# Altium schematic symbol library jlcpcb_2025_04_capacitors_extended_0805.schlib: 3281 symbols (part 3 of 18) (continued)
## 0805F105Z250NT
designator C?  Capacitance: 1uF  (hidden comment: *)
Capacitor, Ceramic (MLCC), 1uF, 25V, Y5V, SMD 0805; Manufacturer: FH(Guangdong Fenghua Advanced Tech); Manufacturer Part Number: 0805F105Z250NT; Temperature Rating: -20%~+80%; Package Size: 0805; JLCPCB Basic Part: No; JLCPCB Part Number: C285184; Supplier 1: LCSC; Category: Capacitors - MLCC; Supplier Part Number 1: C285184; Voltage Rating: 25V; Temperature Coefficient: Y5V; RoHS: Yes; ComponentLink1Description: Datasheet; ComponentLink1URL: https://wmsc.lcsc.com/wmsc/upload/file/pdf/v2/lcsc/2304140030_FH--Guangdong-Fenghua-Advanced-Tech-0805F105Z250NT_C285184.pdf; ComponentLink2Description: JLCPCB Part URL; ComponentLink2URL: https://jlcpcb.com/partdetail/C285184; ComponentLink3Description: LCSC Part URL; ComponentLink3URL: https://lcsc.com/product-detail/Multilayer-Ceramic-Capacitors-MLCC---SMD-SMT_FH-Guangdong-Fenghua-Advanced-Tech-FH-Guangdong-Fenghua-Advanced-Tech-0805F105Z250NT_C285184.html
footprint CAP-0805 (0805 (2012M) Capacitor)
pins: 1, 2

## 0805F105Z500CT
designator C?  Capacitance: 1uF  (hidden comment: *)
Capacitor, Ceramic (MLCC), 1uF, 50V, Y5V, SMD 0805; Manufacturer: Walsin Tech Corp; Manufacturer Part Number: 0805F105Z500CT; Temperature Rating: -20%~+80%; Package Size: 0805; JLCPCB Basic Part: No; JLCPCB Part Number: C123630; Supplier 1: LCSC; Category: Capacitors - MLCC; Supplier Part Number 1: C123630; Voltage Rating: 50V; Temperature Coefficient: Y5V; RoHS: Yes; ComponentLink1Description: Datasheet; ComponentLink1URL: https://wmsc.lcsc.com/wmsc/upload/file/pdf/v2/lcsc/2304140030_Walsin-Tech-Corp-0805F105Z500CT_C123630.pdf; ComponentLink2Description: JLCPCB Part URL; ComponentLink2URL: https://jlcpcb.com/partdetail/C123630; ComponentLink3Description: LCSC Part URL; ComponentLink3URL: https://lcsc.com/product-detail/Multilayer-Ceramic-Capacitors-MLCC---SMD-SMT_Walsin-Tech-Corp-Walsin-Tech-Corp-0805F105Z500CT_C123630.html
footprint CAP-0805 (0805 (2012M) Capacitor)
pins: 1, 2

## 0805F105Z500NT
designator C?  Capacitance: 1uF  (hidden comment: *)
Capacitor, Ceramic (MLCC), 1uF, 50V, SMD 0805; Manufacturer: FH (Guangdong Fenghua Advanced Tech); Manufacturer Part Number: 0805F105Z500NT; Package Size: 0805; JLCPCB Basic Part: No; JLCPCB Part Number: C2894314; Supplier 1: LCSC; Category: Capacitors - MLCC; Supplier Part Number 1: C2894314; Voltage Rating: 50V; RoHS: Yes; ComponentLink1Description: Datasheet; ComponentLink1URL: https://wmsc.lcsc.com/wmsc/upload/file/pdf/v2/lcsc/2109100930_FH--Guangdong-Fenghua-Advanced-Tech-0805F105Z500NT_C2894314.pdf; ComponentLink2Description: JLCPCB Part URL; ComponentLink2URL: https://jlcpcb.com/partdetail/C2894314; ComponentLink3Description: LCSC Part URL; ComponentLink3URL: https://lcsc.com/product-detail/Multilayer-Ceramic-Capacitors-MLCC---SMD-SMT_FH-Guangdong-Fenghua-Advanced-Tech-FH-Guangdong-Fenghua-Advanced-Tech-0805F105Z500NT_C2894314.html
footprint CAP-0805 (0805 (2012M) Capacitor)
pins: 1, 2

## 0805F106M100NT
designator C?  Capacitance: 10uF  (hidden comment: *)
Capacitor, Ceramic (MLCC), 10uF, ±20%, 10V, Y5V, ±20%, SMD 0805; Manufacturer: FH(Guangdong Fenghua Advanced Tech); Manufacturer Part Number: 0805F106M100NT; Package Size: 0805; JLCPCB Basic Part: No; JLCPCB Part Number: C91158; Supplier 1: LCSC; Category: Capacitors - MLCC; Supplier Part Number 1: C91158; Tolerance: ±20%; Voltage Rating: 10V; Temperature Coefficient: Y5V; RoHS: Yes; ComponentLink1Description: Datasheet; ComponentLink1URL: https://wmsc.lcsc.com/wmsc/upload/file/pdf/v2/lcsc/2304140030_FH--Guangdong-Fenghua-Advanced-Tech-0805F106M100NT_C91158.pdf; ComponentLink2Description: JLCPCB Part URL; ComponentLink2URL: https://jlcpcb.com/partdetail/C91158; ComponentLink3Description: LCSC Part URL; ComponentLink3URL: https://lcsc.com/product-detail/Multilayer-Ceramic-Capacitors-MLCC---SMD-SMT_FH-Guangdong-Fenghua-Advanced-Tech-FH-Guangdong-Fenghua-Advanced-Tech-0805F106M100NT_C91158.html
footprint CAP-0805 (0805 (2012M) Capacitor)
pins: 1, 2

## 0805F106M160NT_C90545
designator C?  Capacitance: 10uF  (hidden comment: *)
Capacitor, Ceramic (MLCC), 10uF, ±20%, 16V, Y5V, ±20%, SMD 0805; Manufacturer: FH(Guangdong Fenghua Advanced Tech); Manufacturer Part Number: 0805F106M160NT; Package Size: 0805; JLCPCB Basic Part: No; JLCPCB Part Number: C90545; Supplier 1: LCSC; Category: Capacitors - MLCC; Supplier Part Number 1: C90545; Tolerance: ±20%; Voltage Rating: 16V; Temperature Coefficient: Y5V; RoHS: Yes; ComponentLink1Description: Datasheet; ComponentLink1URL: https://wmsc.lcsc.com/wmsc/upload/file/pdf/v2/lcsc/2304140030_FH--Guangdong-Fenghua-Advanced-Tech-0805F106M160NT_C90545.pdf; ComponentLink2Description: JLCPCB Part URL; ComponentLink2URL: https://jlcpcb.com/partdetail/C90545; ComponentLink3Description: LCSC Part URL; ComponentLink3URL: https://lcsc.com/product-detail/Multilayer-Ceramic-Capacitors-MLCC---SMD-SMT_FH-Guangdong-Fenghua-Advanced-Tech-FH-Guangdong-Fenghua-Advanced-Tech-0805F106M160NT_C90545.html
footprint CAP-0805 (0805 (2012M) Capacitor)
pins: 1, 2

## 0805F106M160NT_C5140354
designator C?  Capacitance: 10uF  (hidden comment: *)
Capacitor, Ceramic (MLCC), 10uF, ±20%, 16V, Y5V, ±20%, SMD 0805; Manufacturer: FH (Guangdong Fenghua Advanced Tech); Manufacturer Part Number: 0805F106M160NT; Package Size: 0805; JLCPCB Basic Part: No; JLCPCB Part Number: C5140354; Supplier 1: LCSC; Category: Capacitors - MLCC; Supplier Part Number 1: C5140354; Tolerance: ±20%; Voltage Rating: 16V; Temperature Coefficient: Y5V; RoHS: Yes; ComponentLink1Description: Datasheet; ComponentLink1URL: https://wmsc.lcsc.com/wmsc/upload/file/pdf/v2/lcsc/2208121800_FH--Guangdong-Fenghua-Advanced-Tech-0805F106M160NT_C5140354.pdf; ComponentLink2Description: JLCPCB Part URL; ComponentLink2URL: https://jlcpcb.com/partdetail/C5140354; ComponentLink3Description: LCSC Part URL; ComponentLink3URL: https://lcsc.com/product-detail/Multilayer-Ceramic-Capacitors-MLCC---SMD-SMT_FH-Guangdong-Fenghua-Advanced-Tech-FH-Guangdong-Fenghua-Advanced-Tech-0805F106M160NT_C5140354.html
footprint CAP-0805 (0805 (2012M) Capacitor)
pins: 1, 2

## 0805F106Z100CT
designator C?  Capacitance: 10uF  (hidden comment: *)
Capacitor, Ceramic (MLCC), 10uF, 10V, Y5V, SMD 0805; Manufacturer: Walsin Tech Corp; Manufacturer Part Number: 0805F106Z100CT; Temperature Rating: -20%~+80%; Package Size: 0805; JLCPCB Basic Part: No; JLCPCB Part Number: C83061; Supplier 1: LCSC; Category: Capacitors - MLCC; Supplier Part Number 1: C83061; Voltage Rating: 10V; Temperature Coefficient: Y5V; RoHS: Yes; ComponentLink1Description: Datasheet; ComponentLink1URL: https://wmsc.lcsc.com/wmsc/upload/file/pdf/v2/lcsc/1810231215_Walsin-Tech-Corp-0805F106Z100CT_C83061.pdf; ComponentLink2Description: JLCPCB Part URL; ComponentLink2URL: https://jlcpcb.com/partdetail/C83061; ComponentLink3Description: LCSC Part URL; ComponentLink3URL: https://lcsc.com/product-detail/Multilayer-Ceramic-Capacitors-MLCC---SMD-SMT_Walsin-Tech-Corp-Walsin-Tech-Corp-0805F106Z100CT_C83061.html
footprint CAP-0805 (0805 (2012M) Capacitor)
pins: 1, 2

## 0805F123M500NT
designator C?  Capacitance: 12nF  (hidden comment: *)
Capacitor, Ceramic (MLCC), 12nF, ±20%, 50V, Y5V, ±20%, SMD 0805; Manufacturer: FH(Guangdong Fenghua Advanced Tech); Manufacturer Part Number: 0805F123M500NT; Package Size: 0805; JLCPCB Basic Part: No; JLCPCB Part Number: C1763; Supplier 1: LCSC; Category: Capacitors - MLCC; Supplier Part Number 1: C1763; Tolerance: ±20%; Voltage Rating: 50V; Temperature Coefficient: Y5V; RoHS: Yes; ComponentLink1Description: Datasheet; ComponentLink1URL: https://wmsc.lcsc.com/wmsc/upload/file/pdf/v2/lcsc/2304140030_FH--Guangdong-Fenghua-Advanced-Tech-0805F123M500NT_C1763.pdf; ComponentLink2Description: JLCPCB Part URL; ComponentLink2URL: https://jlcpcb.com/partdetail/C1763; ComponentLink3Description: LCSC Part URL; ComponentLink3URL: https://lcsc.com/product-detail/Multilayer-Ceramic-Capacitors-MLCC---SMD-SMT_FH-Guangdong-Fenghua-Advanced-Tech-FH-Guangdong-Fenghua-Advanced-Tech-0805F123M500NT_C1763.html
footprint CAP-0805 (0805 (2012M) Capacitor)
pins: 1, 2

## 0805F124M500NT
designator C?  Capacitance: 120nF  (hidden comment: *)
Capacitor, Ceramic (MLCC), 120nF, ±20%, 50V, Y5V, ±20%, SMD 0805; Manufacturer: FH(Guangdong Fenghua Advanced Tech); Manufacturer Part Number: 0805F124M500NT; Package Size: 0805; JLCPCB Basic Part: No; JLCPCB Part Number: C1764; Supplier 1: LCSC; Category: Capacitors - MLCC; Supplier Part Number 1: C1764; Tolerance: ±20%; Voltage Rating: 50V; Temperature Coefficient: Y5V; RoHS: Yes; ComponentLink1Description: Datasheet; ComponentLink1URL: https://wmsc.lcsc.com/wmsc/upload/file/pdf/v2/lcsc/2304140030_FH--Guangdong-Fenghua-Advanced-Tech-0805F124M500NT_C1764.pdf; ComponentLink2Description: JLCPCB Part URL; ComponentLink2URL: https://jlcpcb.com/partdetail/C1764; ComponentLink3Description: LCSC Part URL; ComponentLink3URL: https://lcsc.com/product-detail/Multilayer-Ceramic-Capacitors-MLCC---SMD-SMT_FH-Guangdong-Fenghua-Advanced-Tech-FH-Guangdong-Fenghua-Advanced-Tech-0805F124M500NT_C1764.html
footprint CAP-0805 (0805 (2012M) Capacitor)
pins: 1, 2

## 0805F153M500NT
designator C?  Capacitance: 15nF  (hidden comment: *)
Capacitor, Ceramic (MLCC), 15nF, ±20%, 50V, Y5V, ±20%, SMD 0805; Manufacturer: FH(Guangdong Fenghua Advanced Tech); Manufacturer Part Number: 0805F153M500NT; Package Size: 0805; JLCPCB Basic Part: No; JLCPCB Part Number: C1765; Supplier 1: LCSC; Category: Capacitors - MLCC; Supplier Part Number 1: C1765; Tolerance: ±20%; Voltage Rating: 50V; Temperature Coefficient: Y5V; RoHS: Yes; ComponentLink1Description: Datasheet; ComponentLink1URL: https://wmsc.lcsc.com/wmsc/upload/file/pdf/v2/lcsc/2304140030_FH--Guangdong-Fenghua-Advanced-Tech-0805F153M500NT_C1765.pdf; ComponentLink2Description: JLCPCB Part URL; ComponentLink2URL: https://jlcpcb.com/partdetail/C1765; ComponentLink3Description: LCSC Part URL; ComponentLink3URL: https://lcsc.com/product-detail/Multilayer-Ceramic-Capacitors-MLCC---SMD-SMT_FH-Guangdong-Fenghua-Advanced-Tech-FH-Guangdong-Fenghua-Advanced-Tech-0805F153M500NT_C1765.html
footprint CAP-0805 (0805 (2012M) Capacitor)
pins: 1, 2

## 0805F183M500NT
designator C?  Capacitance: 18nF  (hidden comment: *)
Capacitor, Ceramic (MLCC), 18nF, ±20%, 50V, Y5V, ±20%, SMD 0805; Manufacturer: FH(Guangdong Fenghua Advanced Tech); Manufacturer Part Number: 0805F183M500NT; Package Size: 0805; JLCPCB Basic Part: No; JLCPCB Part Number: C1767; Supplier 1: LCSC; Category: Capacitors - MLCC; Supplier Part Number 1: C1767; Tolerance: ±20%; Voltage Rating: 50V; Temperature Coefficient: Y5V; RoHS: Yes; ComponentLink1Description: Datasheet; ComponentLink1URL: https://wmsc.lcsc.com/wmsc/upload/file/pdf/v2/lcsc/2304140030_FH--Guangdong-Fenghua-Advanced-Tech-0805F183M500NT_C1767.pdf; ComponentLink2Description: JLCPCB Part URL; ComponentLink2URL: https://jlcpcb.com/partdetail/C1767; ComponentLink3Description: LCSC Part URL; ComponentLink3URL: https://lcsc.com/product-detail/Multilayer-Ceramic-Capacitors-MLCC---SMD-SMT_FH-Guangdong-Fenghua-Advanced-Tech-FH-Guangdong-Fenghua-Advanced-Tech-0805F183M500NT_C1767.html
footprint CAP-0805 (0805 (2012M) Capacitor)
pins: 1, 2

## 0805F203M500NT
designator C?  Capacitance: 20nF  (hidden comment: *)
Capacitor, Ceramic (MLCC), 20nF, ±20%, 50V, Y5V, ±20%, SMD 0805; Manufacturer: FH(Guangdong Fenghua Advanced Tech); Manufacturer Part Number: 0805F203M500NT; Package Size: 0805; JLCPCB Basic Part: No; JLCPCB Part Number: C1768; Supplier 1: LCSC; Category: Capacitors - MLCC; Supplier Part Number 1: C1768; Tolerance: ±20%; Voltage Rating: 50V; Temperature Coefficient: Y5V; RoHS: Yes; ComponentLink1Description: Datasheet; ComponentLink1URL: https://wmsc.lcsc.com/wmsc/upload/file/pdf/v2/lcsc/2304140030_FH--Guangdong-Fenghua-Advanced-Tech-0805F203M500NT_C1768.pdf; ComponentLink2Description: JLCPCB Part URL; ComponentLink2URL: https://jlcpcb.com/partdetail/C1768; ComponentLink3Description: LCSC Part URL; ComponentLink3URL: https://lcsc.com/product-detail/Multilayer-Ceramic-Capacitors-MLCC---SMD-SMT_FH-Guangdong-Fenghua-Advanced-Tech-FH-Guangdong-Fenghua-Advanced-Tech-0805F203M500NT_C1768.html
footprint CAP-0805 (0805 (2012M) Capacitor)
pins: 1, 2

## 0805F204M500NT
designator C?  Capacitance: 200000pF  (hidden comment: *)
Capacitor, Ceramic (MLCC), 200000pF, ±20%, 50V, Y5V, ±20%, SMD 0805; Manufacturer: FH (Guangdong Fenghua Advanced Tech); Manufacturer Part Number: 0805F204M500NT; Package Size: 0805; JLCPCB Basic Part: No; JLCPCB Part Number: C967588; Supplier 1: LCSC; Category: Capacitors - MLCC; Supplier Part Number 1: C967588; Tolerance: ±20%; Voltage Rating: 50V; Temperature Coefficient: Y5V; RoHS: Yes; ComponentLink1Description: Datasheet; ComponentLink1URL: https://wmsc.lcsc.com/wmsc/upload/file/pdf/v2/lcsc/2304140030_FH--Guangdong-Fenghua-Advanced-Tech-0805F204M500NT_C967588.pdf; ComponentLink2Description: JLCPCB Part URL; ComponentLink2URL: https://jlcpcb.com/partdetail/C967588; ComponentLink3Description: LCSC Part URL; ComponentLink3URL: https://lcsc.com/product-detail/Multilayer-Ceramic-Capacitors-MLCC---SMD-SMT_FH-Guangdong-Fenghua-Advanced-Tech-FH-Guangdong-Fenghua-Advanced-Tech-0805F204M500NT_C967588.html
footprint CAP-0805 (0805 (2012M) Capacitor)
pins: 1, 2

## 0805F223M500NT
designator C?  Capacitance: 22nF  (hidden comment: *)
Capacitor, Ceramic (MLCC), 22nF, ±20%, 50V, Y5V, ±20%, SMD 0805; Manufacturer: FH(Guangdong Fenghua Advanced Tech); Manufacturer Part Number: 0805F223M500NT; Package Size: 0805; JLCPCB Basic Part: No; JLCPCB Part Number: C1769; Supplier 1: LCSC; Category: Capacitors - MLCC; Supplier Part Number 1: C1769; Tolerance: ±20%; Voltage Rating: 50V; Temperature Coefficient: Y5V; RoHS: Yes; ComponentLink1Description: Datasheet; ComponentLink1URL: https://wmsc.lcsc.com/wmsc/upload/file/pdf/v2/lcsc/2304140030_FH--Guangdong-Fenghua-Advanced-Tech-0805F223M500NT_C1769.pdf; ComponentLink2Description: JLCPCB Part URL; ComponentLink2URL: https://jlcpcb.com/partdetail/C1769; ComponentLink3Description: LCSC Part URL; ComponentLink3URL: https://lcsc.com/product-detail/Multilayer-Ceramic-Capacitors-MLCC---SMD-SMT_FH-Guangdong-Fenghua-Advanced-Tech-FH-Guangdong-Fenghua-Advanced-Tech-0805F223M500NT_C1769.html
footprint CAP-0805 (0805 (2012M) Capacitor)
pins: 1, 2

## 0805F224M500NT
designator C?  Capacitance: 220nF  (hidden comment: *)
Capacitor, Ceramic (MLCC), 220nF, ±20%, 50V, Y5V, ±20%, SMD 0805; Manufacturer: FH(Guangdong Fenghua Advanced Tech); Manufacturer Part Number: 0805F224M500NT; Package Size: 0805; JLCPCB Basic Part: No; JLCPCB Part Number: C1770; Supplier 1: LCSC; Category: Capacitors - MLCC; Supplier Part Number 1: C1770; Tolerance: ±20%; Voltage Rating: 50V; Temperature Coefficient: Y5V; RoHS: Yes; ComponentLink1Description: Datasheet; ComponentLink1URL: https://wmsc.lcsc.com/wmsc/upload/file/pdf/v2/lcsc/2304140030_FH--Guangdong-Fenghua-Advanced-Tech-0805F224M500NT_C1770.pdf; ComponentLink2Description: JLCPCB Part URL; ComponentLink2URL: https://jlcpcb.com/partdetail/C1770; ComponentLink3Description: LCSC Part URL; ComponentLink3URL: https://lcsc.com/product-detail/Multilayer-Ceramic-Capacitors-MLCC---SMD-SMT_FH-Guangdong-Fenghua-Advanced-Tech-FH-Guangdong-Fenghua-Advanced-Tech-0805F224M500NT_C1770.html
footprint CAP-0805 (0805 (2012M) Capacitor)
pins: 1, 2

## 0805F224Z500CT
designator C?  Capacitance: 220nF  (hidden comment: *)
Capacitor, Ceramic (MLCC), 220nF, 50V, Y5V, SMD 0805; Manufacturer: Walsin Tech Corp; Manufacturer Part Number: 0805F224Z500CT; Temperature Rating: -20%~+80%; Package Size: 0805; JLCPCB Basic Part: No; JLCPCB Part Number: C123632; Supplier 1: LCSC; Category: Capacitors - MLCC; Supplier Part Number 1: C123632; Voltage Rating: 50V; Temperature Coefficient: Y5V; RoHS: Yes; ComponentLink1Description: Datasheet; ComponentLink1URL: https://wmsc.lcsc.com/wmsc/upload/file/pdf/v2/lcsc/2304140030_Walsin-Tech-Corp-0805F224Z500CT_C123632.pdf; ComponentLink2Description: JLCPCB Part URL; ComponentLink2URL: https://jlcpcb.com/partdetail/C123632; ComponentLink3Description: LCSC Part URL; ComponentLink3URL: https://lcsc.com/product-detail/Multilayer-Ceramic-Capacitors-MLCC---SMD-SMT_Walsin-Tech-Corp-Walsin-Tech-Corp-0805F224Z500CT_C123632.html
footprint CAP-0805 (0805 (2012M) Capacitor)
pins: 1, 2

## 0805F225M160CT
designator C?  Capacitance: 2.2uF  (hidden comment: *)
Capacitor, Ceramic (MLCC), 2.2uF, ±20%, 16V, Y5V, ±20%, SMD 0805; Manufacturer: Walsin Tech Corp; Manufacturer Part Number: 0805F225M160CT; Package Size: 0805; JLCPCB Basic Part: No; JLCPCB Part Number: C303922; Supplier 1: LCSC; Category: Capacitors - MLCC; Supplier Part Number 1: C303922; Tolerance: ±20%; Voltage Rating: 16V; Temperature Coefficient: Y5V; RoHS: Yes; ComponentLink1Description: Datasheet; ComponentLink1URL: https://wmsc.lcsc.com/wmsc/upload/file/pdf/v2/lcsc/2304140030_Walsin-Tech-Corp-0805F225M160CT_C303922.pdf; ComponentLink2Description: JLCPCB Part URL; ComponentLink2URL: https://jlcpcb.com/partdetail/C303922; ComponentLink3Description: LCSC Part URL; ComponentLink3URL: https://lcsc.com/product-detail/Multilayer-Ceramic-Capacitors-MLCC---SMD-SMT_Walsin-Tech-Corp-Walsin-Tech-Corp-0805F225M160CT_C303922.html
footprint CAP-0805 (0805 (2012M) Capacitor)
pins: 1, 2

## 0805F225M250NT
designator C?  Capacitance: 2.2uF  (hidden comment: *)
Capacitor, Ceramic (MLCC), 2.2uF, ±20%, 25V, Y5V, ±20%, SMD 0805; Manufacturer: FH(Guangdong Fenghua Advanced Tech); Manufacturer Part Number: 0805F225M250NT; Package Size: 0805; JLCPCB Basic Part: No; JLCPCB Part Number: C25031; Supplier 1: LCSC; Category: Capacitors - MLCC; Supplier Part Number 1: C25031; Tolerance: ±20%; Voltage Rating: 25V; Temperature Coefficient: Y5V; RoHS: Yes; ComponentLink1Description: Datasheet; ComponentLink1URL: https://wmsc.lcsc.com/wmsc/upload/file/pdf/v2/lcsc/2304140030_FH--Guangdong-Fenghua-Advanced-Tech-0805F225M250NT_C25031.pdf; ComponentLink2Description: JLCPCB Part URL; ComponentLink2URL: https://jlcpcb.com/partdetail/C25031; ComponentLink3Description: LCSC Part URL; ComponentLink3URL: https://lcsc.com/product-detail/Multilayer-Ceramic-Capacitors-MLCC---SMD-SMT_FH-Guangdong-Fenghua-Advanced-Tech-FH-Guangdong-Fenghua-Advanced-Tech-0805F225M250NT_C25031.html
footprint CAP-0805 (0805 (2012M) Capacitor)
pins: 1, 2

## 0805F225M500NT
designator C?  Capacitance: 2.2uF  (hidden comment: *)
Capacitor, Ceramic (MLCC), 2.2uF, ±20%, 50V, Y5V, ±20%, SMD 0805; Manufacturer: FH(Guangdong Fenghua Advanced Tech); Manufacturer Part Number: 0805F225M500NT; Package Size: 0805; JLCPCB Basic Part: No; JLCPCB Part Number: C49217; Supplier 1: LCSC; Category: Capacitors - MLCC; Supplier Part Number 1: C49217; Tolerance: ±20%; Voltage Rating: 50V; Temperature Coefficient: Y5V; RoHS: Yes; ComponentLink1Description: Datasheet; ComponentLink1URL: https://wmsc.lcsc.com/wmsc/upload/file/pdf/v2/lcsc/2304140030_FH--Guangdong-Fenghua-Advanced-Tech-0805F225M500NT_C49217.pdf; ComponentLink2Description: JLCPCB Part URL; ComponentLink2URL: https://jlcpcb.com/partdetail/C49217; ComponentLink3Description: LCSC Part URL; ComponentLink3URL: https://lcsc.com/product-detail/Multilayer-Ceramic-Capacitors-MLCC---SMD-SMT_FH-Guangdong-Fenghua-Advanced-Tech-FH-Guangdong-Fenghua-Advanced-Tech-0805F225M500NT_C49217.html
footprint CAP-0805 (0805 (2012M) Capacitor)
pins: 1, 2

## 0805F225Z100CT
designator C?  Capacitance: 2.2uF  (hidden comment: *)
Capacitor, Ceramic (MLCC), 2.2uF, 10V, Y5V, SMD 0805; Manufacturer: Walsin Tech Corp; Manufacturer Part Number: 0805F225Z100CT; Temperature Rating: -20%~+80%; Package Size: 0805; JLCPCB Basic Part: No; JLCPCB Part Number: C163162; Supplier 1: LCSC; Category: Capacitors - MLCC; Supplier Part Number 1: C163162; Voltage Rating: 10V; Temperature Coefficient: Y5V; RoHS: Yes; ComponentLink1Description: Datasheet; ComponentLink1URL: https://wmsc.lcsc.com/wmsc/upload/file/pdf/v2/lcsc/2304140030_Walsin-Tech-Corp-0805F225Z100CT_C163162.pdf; ComponentLink2Description: JLCPCB Part URL; ComponentLink2URL: https://jlcpcb.com/partdetail/C163162; ComponentLink3Description: LCSC Part URL; ComponentLink3URL: https://lcsc.com/product-detail/Multilayer-Ceramic-Capacitors-MLCC---SMD-SMT_Walsin-Tech-Corp-Walsin-Tech-Corp-0805F225Z100CT_C163162.html
footprint CAP-0805 (0805 (2012M) Capacitor)
pins: 1, 2

## 0805F225Z250CT
designator C?  Capacitance: 2.2uF  (hidden comment: *)
Capacitor, Ceramic (MLCC), 2.2uF, 25V, Y5V, SMD 0805; Manufacturer: Walsin Tech Corp; Manufacturer Part Number: 0805F225Z250CT; Temperature Rating: -20%~+80%; Package Size: 0805; JLCPCB Basic Part: No; JLCPCB Part Number: C123633; Supplier 1: LCSC; Category: Capacitors - MLCC; Supplier Part Number 1: C123633; Voltage Rating: 25V; Temperature Coefficient: Y5V; RoHS: Yes; ComponentLink1Description: Datasheet; ComponentLink1URL: https://wmsc.lcsc.com/wmsc/upload/file/pdf/v2/lcsc/2304140030_Walsin-Tech-Corp-0805F225Z250CT_C123633.pdf; ComponentLink2Description: JLCPCB Part URL; ComponentLink2URL: https://jlcpcb.com/partdetail/C123633; ComponentLink3Description: LCSC Part URL; ComponentLink3URL: https://lcsc.com/product-detail/Multilayer-Ceramic-Capacitors-MLCC---SMD-SMT_Walsin-Tech-Corp-Walsin-Tech-Corp-0805F225Z250CT_C123633.html
footprint CAP-0805 (0805 (2012M) Capacitor)
pins: 1, 2

## 0805F226Z6R3CT
designator C?  Capacitance: 22uF  (hidden comment: *)
Capacitor, Ceramic (MLCC), 22uF, 6.3V, Y5V, SMD 0805; Manufacturer: Walsin Tech Corp; Manufacturer Part Number: 0805F226Z6R3CT; Temperature Rating: -20%~+80%; Package Size: 0805; JLCPCB Basic Part: No; JLCPCB Part Number: C123635; Supplier 1: LCSC; Category: Capacitors - MLCC; Supplier Part Number 1: C123635; Voltage Rating: 6.3V; Temperature Coefficient: Y5V; RoHS: Yes; ComponentLink1Description: Datasheet; ComponentLink1URL: https://wmsc.lcsc.com/wmsc/upload/file/pdf/v2/lcsc/2304140030_Walsin-Tech-Corp-0805F226Z6R3CT_C123635.pdf; ComponentLink2Description: JLCPCB Part URL; ComponentLink2URL: https://jlcpcb.com/partdetail/C123635; ComponentLink3Description: LCSC Part URL; ComponentLink3URL: https://lcsc.com/product-detail/Multilayer-Ceramic-Capacitors-MLCC---SMD-SMT_Walsin-Tech-Corp-Walsin-Tech-Corp-0805F226Z6R3CT_C123635.html
footprint CAP-0805 (0805 (2012M) Capacitor)
pins: 1, 2

## 0805F273M500NT
designator C?  Capacitance: 27nF  (hidden comment: *)
Capacitor, Ceramic (MLCC), 27nF, ±20%, 50V, Y5V, ±20%, SMD 0805; Manufacturer: FH(Guangdong Fenghua Advanced Tech); Manufacturer Part Number: 0805F273M500NT; Package Size: 0805; JLCPCB Basic Part: No; JLCPCB Part Number: C1773; Supplier 1: LCSC; Category: Capacitors - MLCC; Supplier Part Number 1: C1773; Tolerance: ±20%; Voltage Rating: 50V; Temperature Coefficient: Y5V; RoHS: Yes; ComponentLink1Description: Datasheet; ComponentLink1URL: https://wmsc.lcsc.com/wmsc/upload/file/pdf/v2/lcsc/2304140030_FH--Guangdong-Fenghua-Advanced-Tech-0805F273M500NT_C1773.pdf; ComponentLink2Description: JLCPCB Part URL; ComponentLink2URL: https://jlcpcb.com/partdetail/C1773; ComponentLink3Description: LCSC Part URL; ComponentLink3URL: https://lcsc.com/product-detail/Multilayer-Ceramic-Capacitors-MLCC---SMD-SMT_FH-Guangdong-Fenghua-Advanced-Tech-FH-Guangdong-Fenghua-Advanced-Tech-0805F273M500NT_C1773.html
footprint CAP-0805 (0805 (2012M) Capacitor)
pins: 1, 2

## 0805F333M500NT
designator C?  Capacitance: 33nF  (hidden comment: *)
Capacitor, Ceramic (MLCC), 33nF, ±20%, 50V, Y5V, ±20%, SMD 0805; Manufacturer: FH(Guangdong Fenghua Advanced Tech); Manufacturer Part Number: 0805F333M500NT; Package Size: 0805; JLCPCB Basic Part: No; JLCPCB Part Number: C1774; Supplier 1: LCSC; Category: Capacitors - MLCC; Supplier Part Number 1: C1774; Tolerance: ±20%; Voltage Rating: 50V; Temperature Coefficient: Y5V; RoHS: Yes; ComponentLink1Description: Datasheet; ComponentLink1URL: https://wmsc.lcsc.com/wmsc/upload/file/pdf/v2/lcsc/2304140030_FH--Guangdong-Fenghua-Advanced-Tech-0805F333M500NT_C1774.pdf; ComponentLink2Description: JLCPCB Part URL; ComponentLink2URL: https://jlcpcb.com/partdetail/C1774; ComponentLink3Description: LCSC Part URL; ComponentLink3URL: https://lcsc.com/product-detail/Multilayer-Ceramic-Capacitors-MLCC---SMD-SMT_FH-Guangdong-Fenghua-Advanced-Tech-FH-Guangdong-Fenghua-Advanced-Tech-0805F333M500NT_C1774.html
footprint CAP-0805 (0805 (2012M) Capacitor)
pins: 1, 2

## 0805F335Z160
designator C?  Capacitance: 3.3uF  (hidden comment: *)
Capacitor, Ceramic (MLCC), 3.3uF, 16V, Y5V, SMD 0805; Manufacturer: Walsin Tech Corp; Manufacturer Part Number: 0805F335Z160; Temperature Rating: -20%~+80%; Package Size: 0805; JLCPCB Basic Part: No; JLCPCB Part Number: C152980; Supplier 1: LCSC; Category: Capacitors - MLCC; Supplier Part Number 1: C152980; Voltage Rating: 16V; Temperature Coefficient: Y5V; RoHS: Yes; ComponentLink1Description: Datasheet; ComponentLink1URL: https://wmsc.lcsc.com/wmsc/upload/file/pdf/v2/lcsc/2304140030_Walsin-Tech-Corp-0805F335Z160_C152980.pdf; ComponentLink2Description: JLCPCB Part URL; ComponentLink2URL: https://jlcpcb.com/partdetail/C152980; ComponentLink3Description: LCSC Part URL; ComponentLink3URL: https://lcsc.com/product-detail/Multilayer-Ceramic-Capacitors-MLCC---SMD-SMT_Walsin-Tech-Corp-Walsin-Tech-Corp-0805F335Z160_C152980.html
footprint CAP-0805 (0805 (2012M) Capacitor)
pins: 1, 2

## 0805F393M500NT
designator C?  Capacitance: 39nF  (hidden comment: *)
Capacitor, Ceramic (MLCC), 39nF, ±20%, 50V, Y5V, ±20%, SMD 0805; Manufacturer: FH(Guangdong Fenghua Advanced Tech); Manufacturer Part Number: 0805F393M500NT; Package Size: 0805; JLCPCB Basic Part: No; JLCPCB Part Number: C1776; Supplier 1: LCSC; Category: Capacitors - MLCC; Supplier Part Number 1: C1776; Tolerance: ±20%; Voltage Rating: 50V; Temperature Coefficient: Y5V; RoHS: Yes; ComponentLink1Description: Datasheet; ComponentLink1URL: https://wmsc.lcsc.com/wmsc/upload/file/pdf/v2/lcsc/2304140030_FH--Guangdong-Fenghua-Advanced-Tech-0805F393M500NT_C1776.pdf; ComponentLink2Description: JLCPCB Part URL; ComponentLink2URL: https://jlcpcb.com/partdetail/C1776; ComponentLink3Description: LCSC Part URL; ComponentLink3URL: https://lcsc.com/product-detail/Multilayer-Ceramic-Capacitors-MLCC---SMD-SMT_FH-Guangdong-Fenghua-Advanced-Tech-FH-Guangdong-Fenghua-Advanced-Tech-0805F393M500NT_C1776.html
footprint CAP-0805 (0805 (2012M) Capacitor)
pins: 1, 2

## 0805F394M500NT
designator C?  Capacitance: 390nF  (hidden comment: *)
Capacitor, Ceramic (MLCC), 390nF, ±20%, 50V, Y5V, ±20%, SMD 0805; Manufacturer: FH(Guangdong Fenghua Advanced Tech); Manufacturer Part Number: 0805F394M500NT; Package Size: 0805; JLCPCB Basic Part: No; JLCPCB Part Number: C56360; Supplier 1: LCSC; Category: Capacitors - MLCC; Supplier Part Number 1: C56360; Tolerance: ±20%; Voltage Rating: 50V; Temperature Coefficient: Y5V; RoHS: Yes; ComponentLink1Description: Datasheet; ComponentLink1URL: https://wmsc.lcsc.com/wmsc/upload/file/pdf/v2/lcsc/2304140030_FH--Guangdong-Fenghua-Advanced-Tech-0805F394M500NT_C56360.pdf; ComponentLink2Description: JLCPCB Part URL; ComponentLink2URL: https://jlcpcb.com/partdetail/C56360; ComponentLink3Description: LCSC Part URL; ComponentLink3URL: https://lcsc.com/product-detail/Multilayer-Ceramic-Capacitors-MLCC---SMD-SMT_FH-Guangdong-Fenghua-Advanced-Tech-FH-Guangdong-Fenghua-Advanced-Tech-0805F394M500NT_C56360.html
footprint CAP-0805 (0805 (2012M) Capacitor)
pins: 1, 2

## 0805F403M500NT
designator C?  Capacitance: 40nF  (hidden comment: *)
Capacitor, Ceramic (MLCC), 40nF, ±20%, 50V, Y5V, ±20%, SMD 0805; Manufacturer: FH(Guangdong Fenghua Advanced Tech); Manufacturer Part Number: 0805F403M500NT; Package Size: 0805; JLCPCB Basic Part: No; JLCPCB Part Number: C502151; Supplier 1: LCSC; Category: Capacitors - MLCC; Supplier Part Number 1: C502151; Tolerance: ±20%; Voltage Rating: 50V; Temperature Coefficient: Y5V; RoHS: Yes; ComponentLink1Description: Datasheet; ComponentLink1URL: https://wmsc.lcsc.com/wmsc/upload/file/pdf/v2/lcsc/2304140030_FH--Guangdong-Fenghua-Advanced-Tech-0805F403M500NT_C502151.pdf; ComponentLink2Description: JLCPCB Part URL; ComponentLink2URL: https://jlcpcb.com/partdetail/C502151; ComponentLink3Description: LCSC Part URL; ComponentLink3URL: https://lcsc.com/product-detail/Multilayer-Ceramic-Capacitors-MLCC---SMD-SMT_FH-Guangdong-Fenghua-Advanced-Tech-FH-Guangdong-Fenghua-Advanced-Tech-0805F403M500NT_C502151.html
footprint CAP-0805 (0805 (2012M) Capacitor)
pins: 1, 2

## 0805F473M500NT
designator C?  Capacitance: 47nF  (hidden comment: *)
Capacitor, Ceramic (MLCC), 47nF, ±20%, 50V, Y5V, ±20%, SMD 0805; Manufacturer: FH(Guangdong Fenghua Advanced Tech); Manufacturer Part Number: 0805F473M500NT; Package Size: 0805; JLCPCB Basic Part: No; JLCPCB Part Number: C1777; Supplier 1: LCSC; Category: Capacitors - MLCC; Supplier Part Number 1: C1777; Tolerance: ±20%; Voltage Rating: 50V; Temperature Coefficient: Y5V; RoHS: Yes; ComponentLink1Description: Datasheet; ComponentLink1URL: https://wmsc.lcsc.com/wmsc/upload/file/pdf/v2/lcsc/2304140030_FH--Guangdong-Fenghua-Advanced-Tech-0805F473M500NT_C1777.pdf; ComponentLink2Description: JLCPCB Part URL; ComponentLink2URL: https://jlcpcb.com/partdetail/C1777; ComponentLink3Description: LCSC Part URL; ComponentLink3URL: https://lcsc.com/product-detail/Multilayer-Ceramic-Capacitors-MLCC---SMD-SMT_FH-Guangdong-Fenghua-Advanced-Tech-FH-Guangdong-Fenghua-Advanced-Tech-0805F473M500NT_C1777.html
footprint CAP-0805 (0805 (2012M) Capacitor)
pins: 1, 2

## 0805F474M500NT
designator C?  Capacitance: 470nF  (hidden comment: *)
Capacitor, Ceramic (MLCC), 470nF, ±20%, 50V, Y5V, ±20%, SMD 0805; Manufacturer: FH(Guangdong Fenghua Advanced Tech); Manufacturer Part Number: 0805F474M500NT; Package Size: 0805; JLCPCB Basic Part: No; JLCPCB Part Number: C1778; Supplier 1: LCSC; Category: Capacitors - MLCC; Supplier Part Number 1: C1778; Tolerance: ±20%; Voltage Rating: 50V; Temperature Coefficient: Y5V; RoHS: Yes; ComponentLink1Description: Datasheet; ComponentLink1URL: https://wmsc.lcsc.com/wmsc/upload/file/pdf/v2/lcsc/2304140030_FH--Guangdong-Fenghua-Advanced-Tech-0805F474M500NT_C1778.pdf; ComponentLink2Description: JLCPCB Part URL; ComponentLink2URL: https://jlcpcb.com/partdetail/C1778; ComponentLink3Description: LCSC Part URL; ComponentLink3URL: https://lcsc.com/product-detail/Multilayer-Ceramic-Capacitors-MLCC---SMD-SMT_FH-Guangdong-Fenghua-Advanced-Tech-FH-Guangdong-Fenghua-Advanced-Tech-0805F474M500NT_C1778.html
footprint CAP-0805 (0805 (2012M) Capacitor)
pins: 1, 2

## 0805F474Z160CT
designator C?  Capacitance: 470nF  (hidden comment: *)
Capacitor, Ceramic (MLCC), 470nF, 16V, Y5V, SMD 0805; Manufacturer: Walsin Tech Corp; Manufacturer Part Number: 0805F474Z160CT; Temperature Rating: -20%~+80%; Package Size: 0805; JLCPCB Basic Part: No; JLCPCB Part Number: C123636; Supplier 1: LCSC; Category: Capacitors - MLCC; Supplier Part Number 1: C123636; Voltage Rating: 16V; Temperature Coefficient: Y5V; RoHS: Yes; ComponentLink1Description: Datasheet; ComponentLink1URL: https://wmsc.lcsc.com/wmsc/upload/file/pdf/v2/lcsc/2304140030_Walsin-Tech-Corp-0805F474Z160CT_C123636.pdf; ComponentLink2Description: JLCPCB Part URL; ComponentLink2URL: https://jlcpcb.com/partdetail/C123636; ComponentLink3Description: LCSC Part URL; ComponentLink3URL: https://lcsc.com/product-detail/Multilayer-Ceramic-Capacitors-MLCC---SMD-SMT_Walsin-Tech-Corp-Walsin-Tech-Corp-0805F474Z160CT_C123636.html
footprint CAP-0805 (0805 (2012M) Capacitor)
pins: 1, 2

## 0805F474Z500CT
designator C?  Capacitance: 470nF  (hidden comment: *)
Capacitor, Ceramic (MLCC), 470nF, 50V, Y5V, SMD 0805; Manufacturer: Walsin Tech Corp; Manufacturer Part Number: 0805F474Z500CT; Temperature Rating: -20%~+80%; Package Size: 0805; JLCPCB Basic Part: No; JLCPCB Part Number: C303923; Supplier 1: LCSC; Category: Capacitors - MLCC; Supplier Part Number 1: C303923; Voltage Rating: 50V; Temperature Coefficient: Y5V; RoHS: Yes; ComponentLink1Description: Datasheet; ComponentLink1URL: https://wmsc.lcsc.com/wmsc/upload/file/pdf/v2/lcsc/2304140030_Walsin-Tech-Corp-0805F474Z500CT_C303923.pdf; ComponentLink2Description: JLCPCB Part URL; ComponentLink2URL: https://jlcpcb.com/partdetail/C303923; ComponentLink3Description: LCSC Part URL; ComponentLink3URL: https://lcsc.com/product-detail/Multilayer-Ceramic-Capacitors-MLCC---SMD-SMT_Walsin-Tech-Corp-Walsin-Tech-Corp-0805F474Z500CT_C303923.html
footprint CAP-0805 (0805 (2012M) Capacitor)
pins: 1, 2

## 0805F475M100CT
designator C?  Capacitance: 4.7uF  (hidden comment: *)
Capacitor, Ceramic (MLCC), 4.7uF, ±20%, 10V, Y5V, ±20%, SMD 0805; Manufacturer: Walsin Tech Corp; Manufacturer Part Number: 0805F475M100CT; Package Size: 0805; JLCPCB Basic Part: No; JLCPCB Part Number: C525052; Supplier 1: LCSC; Category: Capacitors - MLCC; Supplier Part Number 1: C525052; Tolerance: ±20%; Voltage Rating: 10V; Temperature Coefficient: Y5V; RoHS: Yes; ComponentLink1Description: Datasheet; ComponentLink1URL: https://wmsc.lcsc.com/wmsc/upload/file/pdf/v2/lcsc/2304140030_Walsin-Tech-Corp-0805F475M100CT_C525052.pdf; ComponentLink2Description: JLCPCB Part URL; ComponentLink2URL: https://jlcpcb.com/partdetail/C525052; ComponentLink3Description: LCSC Part URL; ComponentLink3URL: https://lcsc.com/product-detail/Multilayer-Ceramic-Capacitors-MLCC---SMD-SMT_Walsin-Tech-Corp-Walsin-Tech-Corp-0805F475M100CT_C525052.html
footprint CAP-0805 (0805 (2012M) Capacitor)
pins: 1, 2

## 0805F475M160NT
designator C?  Capacitance: 4.7uF  (hidden comment: *)
Capacitor, Ceramic (MLCC), 4.7uF, ±20%, 16V, Y5V, ±20%, SMD 0805; Manufacturer: FH(Guangdong Fenghua Advanced Tech); Manufacturer Part Number: 0805F475M160NT; Package Size: 0805; JLCPCB Basic Part: No; JLCPCB Part Number: C131057; Supplier 1: LCSC; Category: Capacitors - MLCC; Supplier Part Number 1: C131057; Tolerance: ±20%; Voltage Rating: 16V; Temperature Coefficient: Y5V; RoHS: Yes; ComponentLink1Description: Datasheet; ComponentLink1URL: https://wmsc.lcsc.com/wmsc/upload/file/pdf/v2/lcsc/2304140030_FH--Guangdong-Fenghua-Advanced-Tech-0805F475M160NT_C131057.pdf; ComponentLink2Description: JLCPCB Part URL; ComponentLink2URL: https://jlcpcb.com/partdetail/C131057; ComponentLink3Description: LCSC Part URL; ComponentLink3URL: https://lcsc.com/product-detail/Multilayer-Ceramic-Capacitors-MLCC---SMD-SMT_FH-Guangdong-Fenghua-Advanced-Tech-FH-Guangdong-Fenghua-Advanced-Tech-0805F475M160NT_C131057.html
footprint CAP-0805 (0805 (2012M) Capacitor)
pins: 1, 2

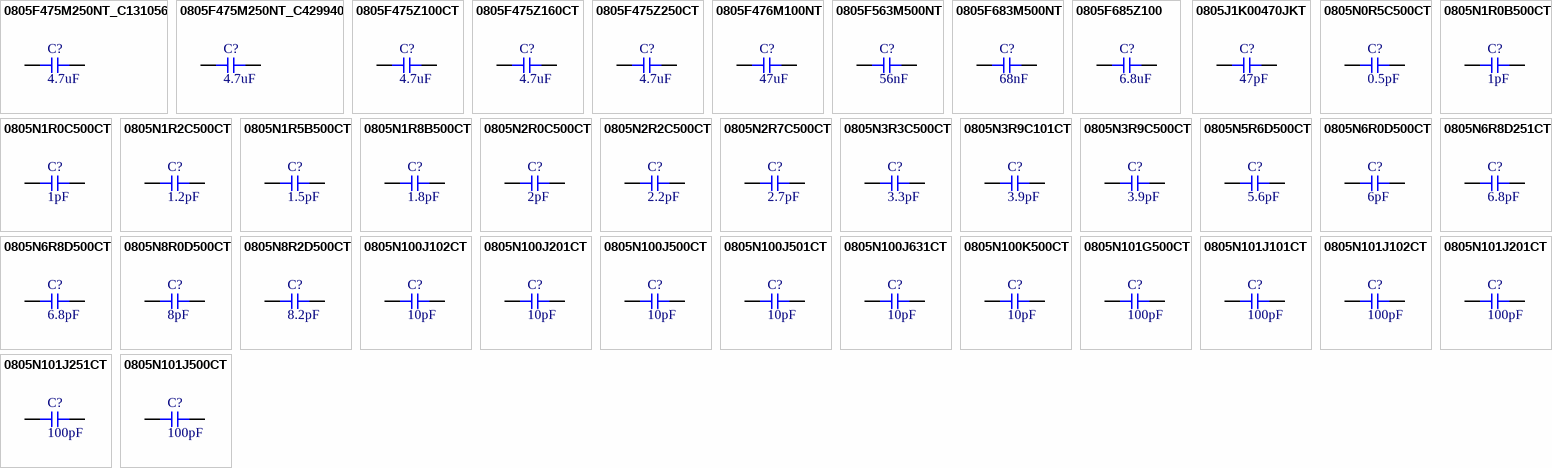
[diagram p13: symbols 0805F475M250NT_C131056 to 0805N101J500CT]

## 0805F475M250NT_C131056
designator C?  Capacitance: 4.7uF  (hidden comment: *)
Capacitor, Ceramic (MLCC), 4.7uF, ±20%, 25V, Y5V, ±20%, SMD 0805; Manufacturer: FH(Guangdong Fenghua Advanced Tech); Manufacturer Part Number: 0805F475M250NT; Package Size: 0805; JLCPCB Basic Part: No; JLCPCB Part Number: C131056; Supplier 1: LCSC; Category: Capacitors - MLCC; Supplier Part Number 1: C131056; Tolerance: ±20%; Voltage Rating: 25V; Temperature Coefficient: Y5V; RoHS: Yes; ComponentLink1Description: Datasheet; ComponentLink1URL: https://wmsc.lcsc.com/wmsc/upload/file/pdf/v2/lcsc/2304140030_FH--Guangdong-Fenghua-Advanced-Tech-0805F475M250NT_C131056.pdf; ComponentLink2Description: JLCPCB Part URL; ComponentLink2URL: https://jlcpcb.com/partdetail/C131056; ComponentLink3Description: LCSC Part URL; ComponentLink3URL: https://lcsc.com/product-detail/Multilayer-Ceramic-Capacitors-MLCC---SMD-SMT_FH-Guangdong-Fenghua-Advanced-Tech-FH-Guangdong-Fenghua-Advanced-Tech-0805F475M250NT_C131056.html
footprint CAP-0805 (0805 (2012M) Capacitor)
pins: 1, 2

## 0805F475M250NT_C429940
designator C?  Capacitance: 4.7uF  (hidden comment: *)
Capacitor, Ceramic (MLCC), 4.7uF, ±20%, 25V, Y5V, ±20%, SMD 0805; Manufacturer: FH(Guangdong Fenghua Advanced Tech); Manufacturer Part Number: 0805F475M250NT; Package Size: 0805; JLCPCB Basic Part: No; JLCPCB Part Number: C429940; Supplier 1: LCSC; Category: Capacitors - MLCC; Supplier Part Number 1: C429940; Tolerance: ±20%; Voltage Rating: 25V; Temperature Coefficient: Y5V; RoHS: Yes; ComponentLink1Description: Datasheet; ComponentLink1URL: https://wmsc.lcsc.com/wmsc/upload/file/pdf/v2/lcsc/2304140030_FH--Guangdong-Fenghua-Advanced-Tech-0805F475M250NT_C429940.pdf; ComponentLink2Description: JLCPCB Part URL; ComponentLink2URL: https://jlcpcb.com/partdetail/C429940; ComponentLink3Description: LCSC Part URL; ComponentLink3URL: https://lcsc.com/product-detail/Multilayer-Ceramic-Capacitors-MLCC---SMD-SMT_FH-Guangdong-Fenghua-Advanced-Tech-FH-Guangdong-Fenghua-Advanced-Tech-0805F475M250NT_C429940.html
footprint CAP-0805 (0805 (2012M) Capacitor)
pins: 1, 2

## 0805F475Z100CT
designator C?  Capacitance: 4.7uF  (hidden comment: *)
Capacitor, Ceramic (MLCC), 4.7uF, 10V, Y5V, SMD 0805; Manufacturer: Walsin Tech Corp; Manufacturer Part Number: 0805F475Z100CT; Temperature Rating: -20%~+80%; Package Size: 0805; JLCPCB Basic Part: No; JLCPCB Part Number: C5122271; Supplier 1: LCSC; Category: Capacitors - MLCC; Supplier Part Number 1: C5122271; Voltage Rating: 10V; Temperature Coefficient: Y5V; RoHS: Yes; ComponentLink1Description: Datasheet; ComponentLink1URL: https://wmsc.lcsc.com/wmsc/upload/file/pdf/v2/lcsc/2208151830_Walsin-Tech-Corp-0805F475Z100CT_C5122271.pdf; ComponentLink2Description: JLCPCB Part URL; ComponentLink2URL: https://jlcpcb.com/partdetail/C5122271; ComponentLink3Description: LCSC Part URL; ComponentLink3URL: https://lcsc.com/product-detail/Multilayer-Ceramic-Capacitors-MLCC---SMD-SMT_Walsin-Tech-Corp-Walsin-Tech-Corp-0805F475Z100CT_C5122271.html
footprint CAP-0805 (0805 (2012M) Capacitor)
pins: 1, 2

## 0805F475Z160CT
designator C?  Capacitance: 4.7uF  (hidden comment: *)
Capacitor, Ceramic (MLCC), 4.7uF, 16V, Y5V, SMD 0805; Manufacturer: Walsin Tech Corp; Manufacturer Part Number: 0805F475Z160CT; Temperature Rating: -20%~+80%; Package Size: 0805; JLCPCB Basic Part: No; JLCPCB Part Number: C123639; Supplier 1: LCSC; Category: Capacitors - MLCC; Supplier Part Number 1: C123639; Voltage Rating: 16V; Temperature Coefficient: Y5V; RoHS: Yes; ComponentLink1Description: Datasheet; ComponentLink1URL: https://wmsc.lcsc.com/wmsc/upload/file/pdf/v2/lcsc/2304140030_Walsin-Tech-Corp-0805F475Z160CT_C123639.pdf; ComponentLink2Description: JLCPCB Part URL; ComponentLink2URL: https://jlcpcb.com/partdetail/C123639; ComponentLink3Description: LCSC Part URL; ComponentLink3URL: https://lcsc.com/product-detail/Multilayer-Ceramic-Capacitors-MLCC---SMD-SMT_Walsin-Tech-Corp-Walsin-Tech-Corp-0805F475Z160CT_C123639.html
footprint CAP-0805 (0805 (2012M) Capacitor)
pins: 1, 2

## 0805F475Z250CT
designator C?  Capacitance: 4.7uF  (hidden comment: *)
Capacitor, Ceramic (MLCC), 4.7uF, 25V, Y5V, SMD 0805; Manufacturer: Walsin Tech Corp; Manufacturer Part Number: 0805F475Z250CT; Temperature Rating: -20%~+80%; Package Size: 0805; JLCPCB Basic Part: No; JLCPCB Part Number: C151869; Supplier 1: LCSC; Category: Capacitors - MLCC; Supplier Part Number 1: C151869; Voltage Rating: 25V; Temperature Coefficient: Y5V; RoHS: Yes; ComponentLink1Description: Datasheet; ComponentLink1URL: https://wmsc.lcsc.com/wmsc/upload/file/pdf/v2/lcsc/2304140030_Walsin-Tech-Corp-0805F475Z250CT_C151869.pdf; ComponentLink2Description: JLCPCB Part URL; ComponentLink2URL: https://jlcpcb.com/partdetail/C151869; ComponentLink3Description: LCSC Part URL; ComponentLink3URL: https://lcsc.com/product-detail/Multilayer-Ceramic-Capacitors-MLCC---SMD-SMT_Walsin-Tech-Corp-Walsin-Tech-Corp-0805F475Z250CT_C151869.html
footprint CAP-0805 (0805 (2012M) Capacitor)
pins: 1, 2

## 0805F476M100NT
designator C?  Capacitance: 47uF  (hidden comment: *)
Capacitor, Ceramic (MLCC), 47uF, ±20%, 10V, Y5V, ±20%, SMD 0805; Manufacturer: FH(Guangdong Fenghua Advanced Tech); Manufacturer Part Number: 0805F476M100NT; Package Size: 0805; JLCPCB Basic Part: No; JLCPCB Part Number: C108658; Supplier 1: LCSC; Category: Capacitors - MLCC; Supplier Part Number 1: C108658; Tolerance: ±20%; Voltage Rating: 10V; Temperature Coefficient: Y5V; RoHS: Yes; ComponentLink1Description: Datasheet; ComponentLink1URL: https://wmsc.lcsc.com/wmsc/upload/file/pdf/v2/lcsc/2304140030_FH--Guangdong-Fenghua-Advanced-Tech-0805F476M100NT_C108658.pdf; ComponentLink2Description: JLCPCB Part URL; ComponentLink2URL: https://jlcpcb.com/partdetail/C108658; ComponentLink3Description: LCSC Part URL; ComponentLink3URL: https://lcsc.com/product-detail/Multilayer-Ceramic-Capacitors-MLCC---SMD-SMT_FH-Guangdong-Fenghua-Advanced-Tech-FH-Guangdong-Fenghua-Advanced-Tech-0805F476M100NT_C108658.html
footprint CAP-0805 (0805 (2012M) Capacitor)
pins: 1, 2

## 0805F563M500NT
designator C?  Capacitance: 56nF  (hidden comment: *)
Capacitor, Ceramic (MLCC), 56nF, ±20%, 50V, Y5V, ±20%, SMD 0805; Manufacturer: FH(Guangdong Fenghua Advanced Tech); Manufacturer Part Number: 0805F563M500NT; Package Size: 0805; JLCPCB Basic Part: No; JLCPCB Part Number: C1780; Supplier 1: LCSC; Category: Capacitors - MLCC; Supplier Part Number 1: C1780; Tolerance: ±20%; Voltage Rating: 50V; Temperature Coefficient: Y5V; RoHS: Yes; ComponentLink1Description: Datasheet; ComponentLink1URL: https://wmsc.lcsc.com/wmsc/upload/file/pdf/v2/lcsc/2304140030_FH--Guangdong-Fenghua-Advanced-Tech-0805F563M500NT_C1780.pdf; ComponentLink2Description: JLCPCB Part URL; ComponentLink2URL: https://jlcpcb.com/partdetail/C1780; ComponentLink3Description: LCSC Part URL; ComponentLink3URL: https://lcsc.com/product-detail/Multilayer-Ceramic-Capacitors-MLCC---SMD-SMT_FH-Guangdong-Fenghua-Advanced-Tech-FH-Guangdong-Fenghua-Advanced-Tech-0805F563M500NT_C1780.html
footprint CAP-0805 (0805 (2012M) Capacitor)
pins: 1, 2

## 0805F683M500NT
designator C?  Capacitance: 68nF  (hidden comment: *)
Capacitor, Ceramic (MLCC), 68nF, ±20%, 50V, Y5V, ±20%, SMD 0805; Manufacturer: FH(Guangdong Fenghua Advanced Tech); Manufacturer Part Number: 0805F683M500NT; Package Size: 0805; JLCPCB Basic Part: No; JLCPCB Part Number: C1781; Supplier 1: LCSC; Category: Capacitors - MLCC; Supplier Part Number 1: C1781; Tolerance: ±20%; Voltage Rating: 50V; Temperature Coefficient: Y5V; RoHS: Yes; ComponentLink1Description: Datasheet; ComponentLink1URL: https://wmsc.lcsc.com/wmsc/upload/file/pdf/v2/lcsc/2304140030_FH--Guangdong-Fenghua-Advanced-Tech-0805F683M500NT_C1781.pdf; ComponentLink2Description: JLCPCB Part URL; ComponentLink2URL: https://jlcpcb.com/partdetail/C1781; ComponentLink3Description: LCSC Part URL; ComponentLink3URL: https://lcsc.com/product-detail/Multilayer-Ceramic-Capacitors-MLCC---SMD-SMT_FH-Guangdong-Fenghua-Advanced-Tech-FH-Guangdong-Fenghua-Advanced-Tech-0805F683M500NT_C1781.html
footprint CAP-0805 (0805 (2012M) Capacitor)
pins: 1, 2

## 0805F685Z100
designator C?  Capacitance: 6.8uF  (hidden comment: *)
Capacitor, Ceramic (MLCC), 6.8uF, 10V, Y5V, SMD 0805; Manufacturer: Walsin Tech Corp; Manufacturer Part Number: 0805F685Z100; Temperature Rating: -20%~+80%; Package Size: 0805; JLCPCB Basic Part: No; JLCPCB Part Number: C152979; Supplier 1: LCSC; Category: Capacitors - MLCC; Supplier Part Number 1: C152979; Voltage Rating: 10V; Temperature Coefficient: Y5V; RoHS: Yes; ComponentLink1Description: Datasheet; ComponentLink1URL: https://wmsc.lcsc.com/wmsc/upload/file/pdf/v2/lcsc/2304140030_Walsin-Tech-Corp-0805F685Z100_C152979.pdf; ComponentLink2Description: JLCPCB Part URL; ComponentLink2URL: https://jlcpcb.com/partdetail/C152979; ComponentLink3Description: LCSC Part URL; ComponentLink3URL: https://lcsc.com/product-detail/Multilayer-Ceramic-Capacitors-MLCC---SMD-SMT_Walsin-Tech-Corp-Walsin-Tech-Corp-0805F685Z100_C152979.html
footprint CAP-0805 (0805 (2012M) Capacitor)
pins: 1, 2

## 0805J1K00470JKT
designator C?  Capacitance: 47pF  (hidden comment: *)
Capacitor, Ceramic (MLCC), 47pF, ±5%, 1kV, C0G, ±5%, SMD 0805; Manufacturer: Knowles; Manufacturer Part Number: 0805J1K00470JKT; Package Size: 0805; JLCPCB Basic Part: No; JLCPCB Part Number: C340547; Supplier 1: LCSC; Category: Capacitors - MLCC; Supplier Part Number 1: C340547; Tolerance: ±5%; Voltage Rating: 1kV; Temperature Coefficient: C0G; RoHS: Yes; ComponentLink1Description: Datasheet; ComponentLink1URL: https://wmsc.lcsc.com/wmsc/upload/file/pdf/v2/lcsc/1912111437_Knowles-0805J1K00470JKT_C340547.pdf; ComponentLink2Description: JLCPCB Part URL; ComponentLink2URL: https://jlcpcb.com/partdetail/C340547; ComponentLink3Description: LCSC Part URL; ComponentLink3URL: https://lcsc.com/product-detail/Multilayer-Ceramic-Capacitors-MLCC---SMD-SMT_Knowles-Knowles-0805J1K00470JKT_C340547.html
footprint CAP-0805 (0805 (2012M) Capacitor)
pins: 1, 2

## 0805N0R5C500CT
designator C?  Capacitance: 0.5pF  (hidden comment: *)
Capacitor, Ceramic (MLCC), 0.5pF, 50V, NP0, SMD 0805; Manufacturer: Walsin Tech Corp; Manufacturer Part Number: 0805N0R5C500CT; Package Size: 0805; JLCPCB Basic Part: No; JLCPCB Part Number: C384749; Supplier 1: LCSC; Category: Capacitors - MLCC; Supplier Part Number 1: C384749; Voltage Rating: 50V; Temperature Coefficient: NP0; RoHS: Yes; ComponentLink1Description: Datasheet; ComponentLink1URL: https://wmsc.lcsc.com/wmsc/upload/file/pdf/v2/lcsc/2304140030_Walsin-Tech-Corp-0805N0R5C500CT_C384749.pdf; ComponentLink2Description: JLCPCB Part URL; ComponentLink2URL: https://jlcpcb.com/partdetail/C384749; ComponentLink3Description: LCSC Part URL; ComponentLink3URL: https://lcsc.com/product-detail/Multilayer-Ceramic-Capacitors-MLCC---SMD-SMT_Walsin-Tech-Corp-Walsin-Tech-Corp-0805N0R5C500CT_C384749.html
footprint CAP-0805 (0805 (2012M) Capacitor)
pins: 1, 2

## 0805N1R0B500CT
designator C?  Capacitance: 1pF  (hidden comment: *)
Capacitor, Ceramic (MLCC), 1pF, 50V, NP0, SMD 0805; Manufacturer: Walsin Tech Corp; Manufacturer Part Number: 0805N1R0B500CT; Package Size: 0805; JLCPCB Basic Part: No; JLCPCB Part Number: C296087; Supplier 1: LCSC; Category: Capacitors - MLCC; Supplier Part Number 1: C296087; Voltage Rating: 50V; Temperature Coefficient: NP0; RoHS: Yes; ComponentLink1Description: Datasheet; ComponentLink1URL: https://wmsc.lcsc.com/wmsc/upload/file/pdf/v2/lcsc/2304140030_Walsin-Tech-Corp-0805N1R0B500CT_C296087.pdf; ComponentLink2Description: JLCPCB Part URL; ComponentLink2URL: https://jlcpcb.com/partdetail/C296087; ComponentLink3Description: LCSC Part URL; ComponentLink3URL: https://lcsc.com/product-detail/Multilayer-Ceramic-Capacitors-MLCC---SMD-SMT_Walsin-Tech-Corp-Walsin-Tech-Corp-0805N1R0B500CT_C296087.html
footprint CAP-0805 (0805 (2012M) Capacitor)
pins: 1, 2

## 0805N1R0C500CT
designator C?  Capacitance: 1pF  (hidden comment: *)
Capacitor, Ceramic (MLCC), 1pF, 50V, NP0, SMD 0805; Manufacturer: Walsin Tech Corp; Manufacturer Part Number: 0805N1R0C500CT; Package Size: 0805; JLCPCB Basic Part: No; JLCPCB Part Number: C424847; Supplier 1: LCSC; Category: Capacitors - MLCC; Supplier Part Number 1: C424847; Voltage Rating: 50V; Temperature Coefficient: NP0; RoHS: Yes; ComponentLink1Description: Datasheet; ComponentLink1URL: https://wmsc.lcsc.com/wmsc/upload/file/pdf/v2/lcsc/2304140030_Walsin-Tech-Corp-0805N1R0C500CT_C424847.pdf; ComponentLink2Description: JLCPCB Part URL; ComponentLink2URL: https://jlcpcb.com/partdetail/C424847; ComponentLink3Description: LCSC Part URL; ComponentLink3URL: https://lcsc.com/product-detail/Multilayer-Ceramic-Capacitors-MLCC---SMD-SMT_Walsin-Tech-Corp-Walsin-Tech-Corp-0805N1R0C500CT_C424847.html
footprint CAP-0805 (0805 (2012M) Capacitor)
pins: 1, 2

## 0805N1R2C500CT
designator C?  Capacitance: 1.2pF  (hidden comment: *)
Capacitor, Ceramic (MLCC), 1.2pF, 50V, NP0, SMD 0805; Manufacturer: Walsin Tech Corp; Manufacturer Part Number: 0805N1R2C500CT; Package Size: 0805; JLCPCB Basic Part: No; JLCPCB Part Number: C296088; Supplier 1: LCSC; Category: Capacitors - MLCC; Supplier Part Number 1: C296088; Voltage Rating: 50V; Temperature Coefficient: NP0; RoHS: Yes; ComponentLink1Description: Datasheet; ComponentLink1URL: https://wmsc.lcsc.com/wmsc/upload/file/pdf/v2/lcsc/2304140030_Walsin-Tech-Corp-0805N1R2C500CT_C296088.pdf; ComponentLink2Description: JLCPCB Part URL; ComponentLink2URL: https://jlcpcb.com/partdetail/C296088; ComponentLink3Description: LCSC Part URL; ComponentLink3URL: https://lcsc.com/product-detail/Multilayer-Ceramic-Capacitors-MLCC---SMD-SMT_Walsin-Tech-Corp-Walsin-Tech-Corp-0805N1R2C500CT_C296088.html
footprint CAP-0805 (0805 (2012M) Capacitor)
pins: 1, 2